# Altium footprint library LUMI_Handy_Soldering_LIB.PcbLib: 562 footprints (part 1 of 36)
Each footprint in its own frame and in the unit in brackets; x right, y up, seen from the top. Pads: shape width x height; smd on the part's side, far side on the other; paste and mask are expansions set on the pad; w line width, h text height; cw(c..) or ccw(c..) is an arc to the next point about the centre after c.
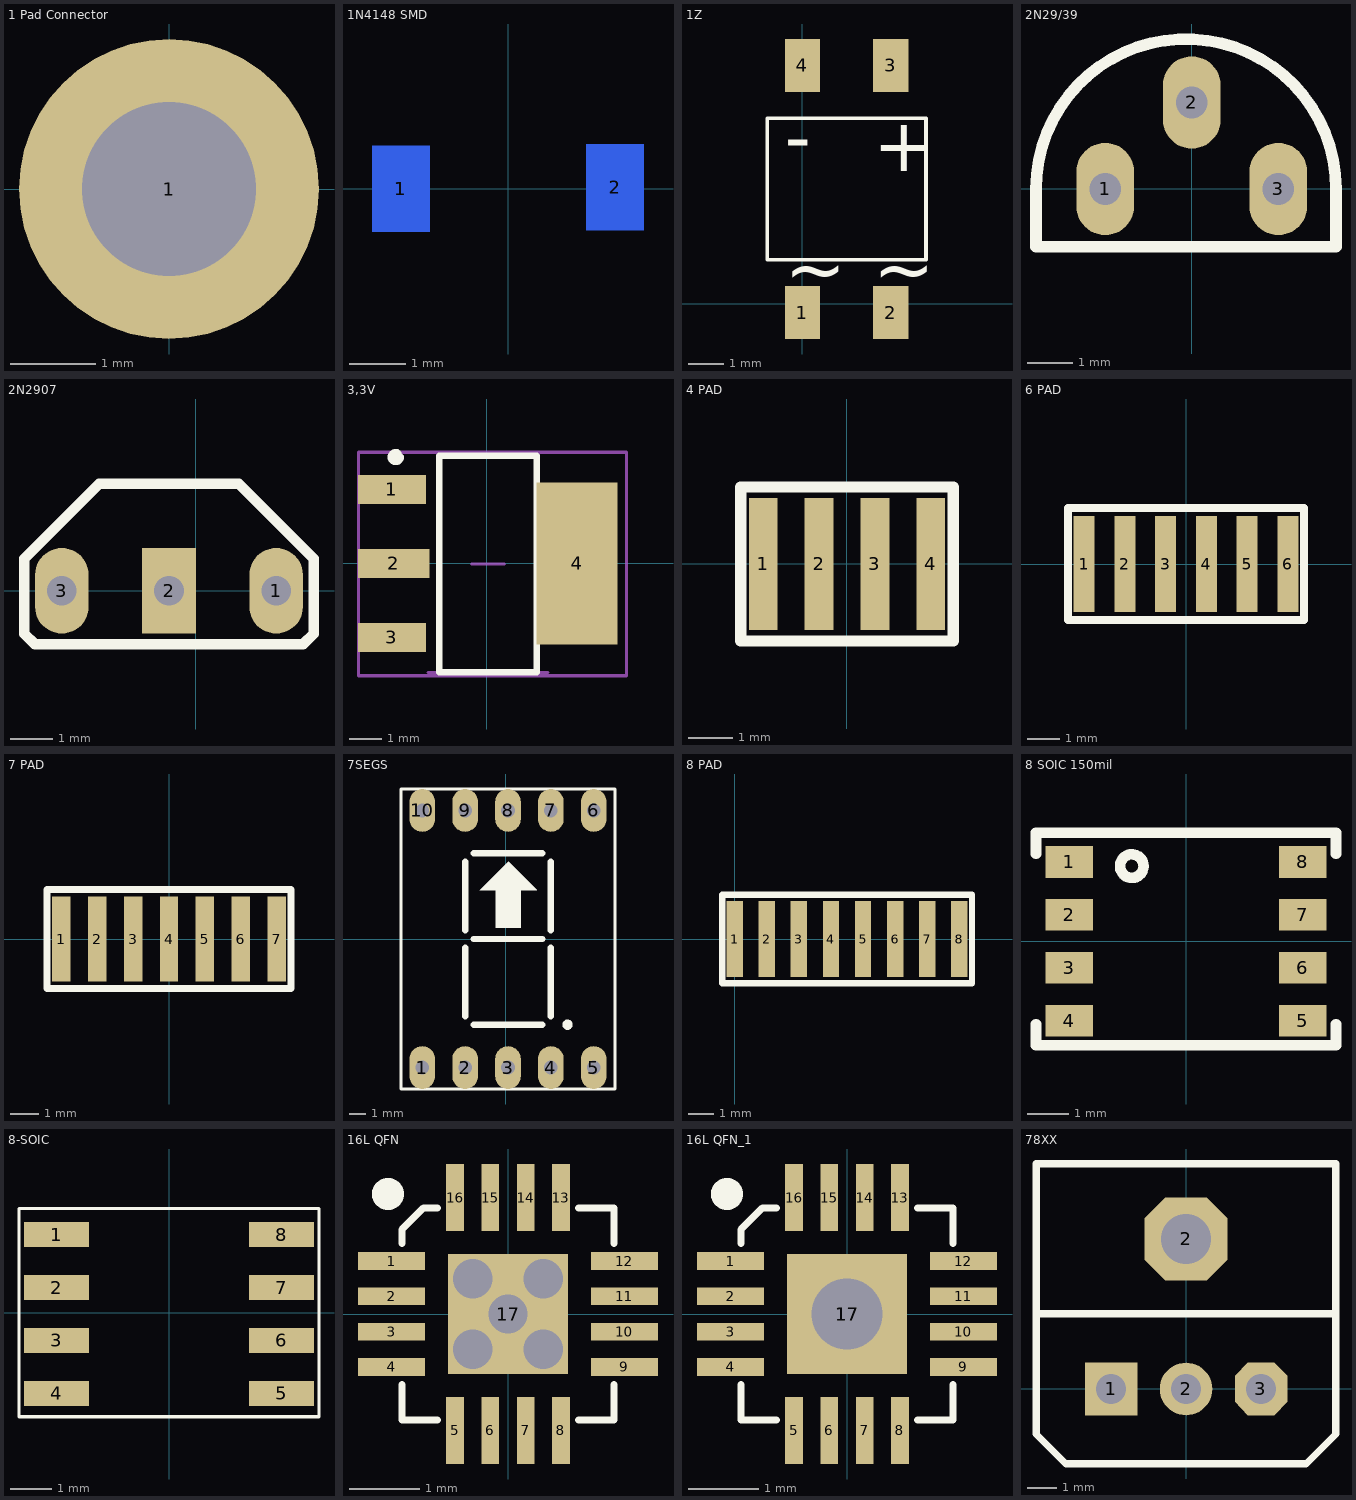
[diagram p0: the footprints below, top view; thin cyan lines are the x and y axes]

## 1 Pad Connector [mm] "1 Pad han day noi"
pads (1):
  round 3.5 hole 2.032: 1(0,0)

## 1N4148 SMD [mil]
pads (2):
  rect 40x60 smd far side: 1(-74.8,0) 2(74.8,0.98)
Bottom Overlay:
  rectangle: -55.12,-30 -23.62,30
  rectangle: 31.5,-31.5 55.12,30
  lines w1.97: -53.31,-23.62 -53.25,23.62 ; 53.31,-23.62 53.37,23.62 ; -95.47,-30 -95.47,30 95.47,30 95.47,-30 -95.47,-30
  lines w10: -5.5,-24.5 19,0 19,1 -5,25
3D body: height -15.75, standoff -78.74, extent -72.84,-31.5 72.84,31.5

## 1Z [mm]
pads (4):
  rect 1x1.5 smd: 1(0,-0.25) 2(2.5,-0.25) 3(2.5,6.75) 4(0,6.75)
Top Overlay:
  lines w0.1: -1,1.25 -1,5.25 3.5,5.25 3.5,1.25 -1,1.25
  text "-" at -0.5,4 h1.52
  text "+" at 2,3.75 h1.52
  text "~" at -0.5,0.25 h1.52
  text "~" at 2,0.25 h1.52
3D body: height 1.5, standoff 0.2, extent -1,1.25 3.5,5.25

## 2N29/39 [mm]
pads (3):
  oval 1.27x2.032 hole 0.7: 1(-1.905,0) 2(0,1.905) 3(1.905,0)
Top Overlay:
  lines w0.254: -3.429,-1.27 -3.429,0 cw(c-0.127,0) 3.175,0 3.175,-1.27 -3.429,-1.27
3D body: height 7.62, standoff 0, extent -11.751,-5.827 3.429,9.383

## 2N2907 [mm]
pads (3):
  oval 1.27x2.032 hole 0.7: 1(1.905,0) 3(-3.175,0)
  rect 1.27x2.032 hole 0.7: 2(-0.635,0)
Top Overlay:
  lines w0.254: -4.064,-1.016 -3.81,-1.27 2.54,-1.27 2.794,-1.016 2.794,0.762 1.016,2.54 -2.286,2.54 -4.064,0.762 -4.064,-1.016
3D body: height 6.99, standoff -0.71, extent -3.425,-1.6 2.155,2.371

## 3,3V [mm]
pads (4):
  rect 2.1x0.9 smd: 1(-2.921,2.286) 3(-2.921,-2.286)
  rect 2.2x0.9 smd: 2(-2.87,0)
  rect 2.5x5 smd: 4(2.794,0)
Top Overlay:
  lines w0.2: -1.456,-3.368 -1.456,3.332 1.544,3.332 1.544,-3.368 -1.456,-3.368
  lines w0.25: -2.749,3.393 ccw(c-2.806,3.282) -2.681,3.282
Mechanical 13:
  lines w0.1: -1.806,-3.368 1.894,-3.368
Mechanical 15:
  lines w0.1: -0.456,-0.018 0.544,-0.018 ; -3.956,-3.468 -3.956,3.432 4.318,3.432 4.318,-3.468 -3.956,-3.468
3D body: height 1.74, standoff 0.06, extent -3.582,-3.25 3.378,3.25

## 4 PAD [mm]
pads (4):
  rect 0.65x3 smd: 1(-1.905,0) 2(-0.635,0) 3(0.635,0) 4(1.905,0)
Top Overlay:
  lines w0.254: -2.413,-1.75 2.413,-1.75 2.413,1.75 -2.413,1.75 -2.413,-1.75

## 6 PAD [mm]
pads (6):
  rect 0.65x3 smd: 1(-3.175,0) 2(-1.905,0) 3(-0.635,0) 4(0.635,0) 5(1.905,0) 6(3.175,0)
Top Overlay:
  lines w0.254: -3.683,-1.75 -3.683,1.75 3.683,1.75 3.683,-1.75 -3.683,-1.75

## 7 PAD [mm]
pads (7):
  rect 0.65x3 smd: 1(-3.81,0) 2(-2.54,0) 3(-1.27,0) 4(0,0) 5(1.27,0) 6(2.54,0) 7(3.81,0)
Top Overlay:
  lines w0.254: -4.318,-1.75 4.318,-1.75 4.318,1.75 -4.318,1.75 -4.318,-1.75

## 7SEGS [mil] "DIP 10 Leads; Body 12 x 15 mm; Pitch 0.5 mm"
height 300
pads (10):
  oval 60x100 hole 32: 1(-195,-300) 2(-95,-300) 3(5,-300) 4(105,-300) 5(205,-300) 6(205,300) 7(105,300) 8(5,300) 9(-95,300) 10(-195,300)
Top Overlay:
  circle w12: c144,-200 r6
  region: -61,114 5,180 7,180 72,115 72,114 35,114 35,26 -24,26 -24,114
  lines w7: -245,-350 -245,350 255,350 255,-350 -245,-350
  lines w15: -95,-180 -95,-20 ; -95,-180 -95,-20 ; -95,-180 -95,-20 ; -95,-180 -95,-20 ; -95,-180 -95,-20 ; -95,-180 -95,-20 ; -95,-180 -95,-20 ; -95,-180 -95,-20 ; -95,20 -95,180 ; -95,20 -95,180 ; -95,20 -95,180 ; -95,20 -95,180 ; -95,20 -95,180 ; -95,20 -95,180 ; -95,20 -95,180 ; -95,20 -95,180 ; -75,-200 85,-200 ; -75,-200 85,-200 ; -75,-200 85,-200 ; -75,-200 85,-200 ; -75,0 85,0 ; -75,0 85,0 ; -75,0 85,0 ; -75,0 85,0 ; -75,0 85,0 ; -75,0 85,0 ; -75,0 85,0 ; -75,0 85,0 ; -75,200 85,200 ; -75,200 85,200 ; -75,200 85,200 ; -75,200 85,200 ; 105,-180 105,-20 ; 105,-180 105,-20 ; 105,-180 105,-20 ; 105,-180 105,-20 ; 105,-180 105,-20 ; 105,-180 105,-20 ; 105,-180 105,-20 ; 105,-180 105,-20 ; 105,20 105,180 ; 105,20 105,180 ; 105,20 105,180 ; 105,20 105,180 ; 105,20 105,180 ; 105,20 105,180 ; 105,20 105,180 ; 105,20 105,180
3D body: height 316.25, standoff -156.19, extent -245,-375 255,375

## 8 PAD [mm]
pads (8):
  rect 0.65x3 smd: 1(0,0) 2(1.27,0) 3(2.54,0) 4(3.81,0) 5(5.08,0) 6(6.35,0) 7(7.62,0) 8(8.89,0)
Top Overlay:
  lines w0.254: -0.5,-1.75 -0.5,1.75 9.398,1.75 9.398,-1.75 -0.5,-1.75

## 8 SOIC 150mil [mm]
pads (8):
  rect 1.14x0.76 smd: 1(-2.8,1.9) 2(-2.8,0.63) 3(-2.8,-0.64) 4(-2.8,-1.91) 5(2.8,-1.91) 6(2.8,-0.64) 7(2.8,0.63) 8(2.8,1.9)
Top Overlay:
  circle w0.254: c-1.3,1.8 r0.283
  lines w0.254: -3.6,-2 -3.6,-2.5 3.6,-2.5 3.6,-2 ; -3.6,2.1 -3.6,2.6 3.6,2.6 3.6,2.1
3D body: height 1.75, standoff 0, extent -3.1,-2.5 3.1,2.5

## 8-SOIC [mm]
pads (8):
  rect 1.55x0.6 smd: 1(-2.7,1.87) 2(-2.7,0.6) 3(-2.7,-0.67) 4(-2.7,-1.94) 5(2.7,-1.94) 6(2.7,-0.67) 7(2.7,0.6) 8(2.7,1.87)
Top Overlay:
  lines w0.076: -3.6,-2.5 3.6,-2.5 3.6,2.5 -3.6,2.5 -3.6,-2.5
3D body: height 1.75, standoff 0, extent -3,-2.5 3.011,2.5

## 16L QFN [mm]
pads (17):
  rect 0.95x0.25 smd: 1(-1.65,0.75) 2(-1.65,0.25) 3(-1.65,-0.25) 4(-1.65,-0.75) 9(1.65,-0.75) 10(1.65,-0.25) 11(1.65,0.25) 12(1.65,0.75)
  rect 0.25x0.95 smd: 5(-0.75,-1.65) 6(-0.25,-1.65) 7(0.25,-1.65) 8(0.75,-1.65) 13(0.75,1.65) 14(0.25,1.65) 15(-0.25,1.65) 16(-0.75,1.65)
  rect 1.7x1.7 smd: 17(0,0)
via 0,0 diameter 0.584 hole 0.559
via -0.5,-0.5 diameter 0.584 hole 0.559
via 0.5,-0.5 diameter 0.584 hole 0.559
via 0.5,0.5 diameter 0.584 hole 0.559
via -0.5,0.5 diameter 0.584 hole 0.559
Top Overlay:
  circle w0.254: c-1.7,1.7 r0.1
  lines w0.1: -1.5,-1 -1.5,-1.5 -1,-1.5 ; -1.5,1 -1.5,1.2 -1.2,1.5 -1,1.5 ; 1,-1.5 1.5,-1.5 1.5,-1 ; 1,1.5 1.5,1.5 1.5,1
3D body: height 0.9, standoff 0, extent -1.501,-1.501 1.501,1.501

## 16L QFN_1 [mm]
pads (18):
  rect 0.95x0.25 smd: 1(-1.65,0.75) 2(-1.65,0.25) 3(-1.65,-0.25) 4(-1.65,-0.75) 9(1.65,-0.75) 10(1.65,-0.25) 11(1.65,0.25) 12(1.65,0.75)
  rect 0.25x0.95 smd: 5(-0.75,-1.65) 6(-0.25,-1.65) 7(0.25,-1.65) 8(0.75,-1.65) 13(0.75,1.65) 14(0.25,1.65) 15(-0.25,1.65) 16(-0.75,1.65)
  rect 1.7x1.7 smd: 17(0,0)
  round 1.5 hole 1: 17(0,0)
Top Overlay:
  circle w0.254: c-1.7,1.7 r0.1
  lines w0.1: -1.5,-1 -1.5,-1.5 -1,-1.5 ; -1.5,1 -1.5,1.2 -1.2,1.5 -1,1.5 ; 1,-1.5 1.5,-1.5 1.5,-1 ; 1,1.5 1.5,1.5 1.5,1
3D body: height 0.9, standoff 0, extent -1.501,-1.501 1.501,1.501

## 78XX [mil]
pads (4):
  rect 70x70 hole 40: 1(-100,0)
  round 70 hole 40: 2(0,0)
  oct 110.24x110.24 hole 66.93: 2(0,200)
  oct 70x70 hole 40: 3(100,0)
Top Overlay:
  lines w10: -200,100 200,100 ; -200,-60 -200,300 200,300 200,-60 160,-100 -160,-100 -200,-60
3D body: height 854.72, standoff -300, extent -220.72,-58.85 220.73,125.8
3D body: height 980, standoff -142.05, extent -245.03,44 251.03,299.94